# Altium footprint library Components.PcbLib: 127 footprints (part 5 of 8)
Each footprint in its own frame and in the unit in brackets; x right, y up, seen from the top. Pads: shape width x height; smd on the part's side, far side on the other; paste and mask are expansions set on the pad; w line width, h text height; cw(c..) or ccw(c..) is an arc to the next point about the centre after c.
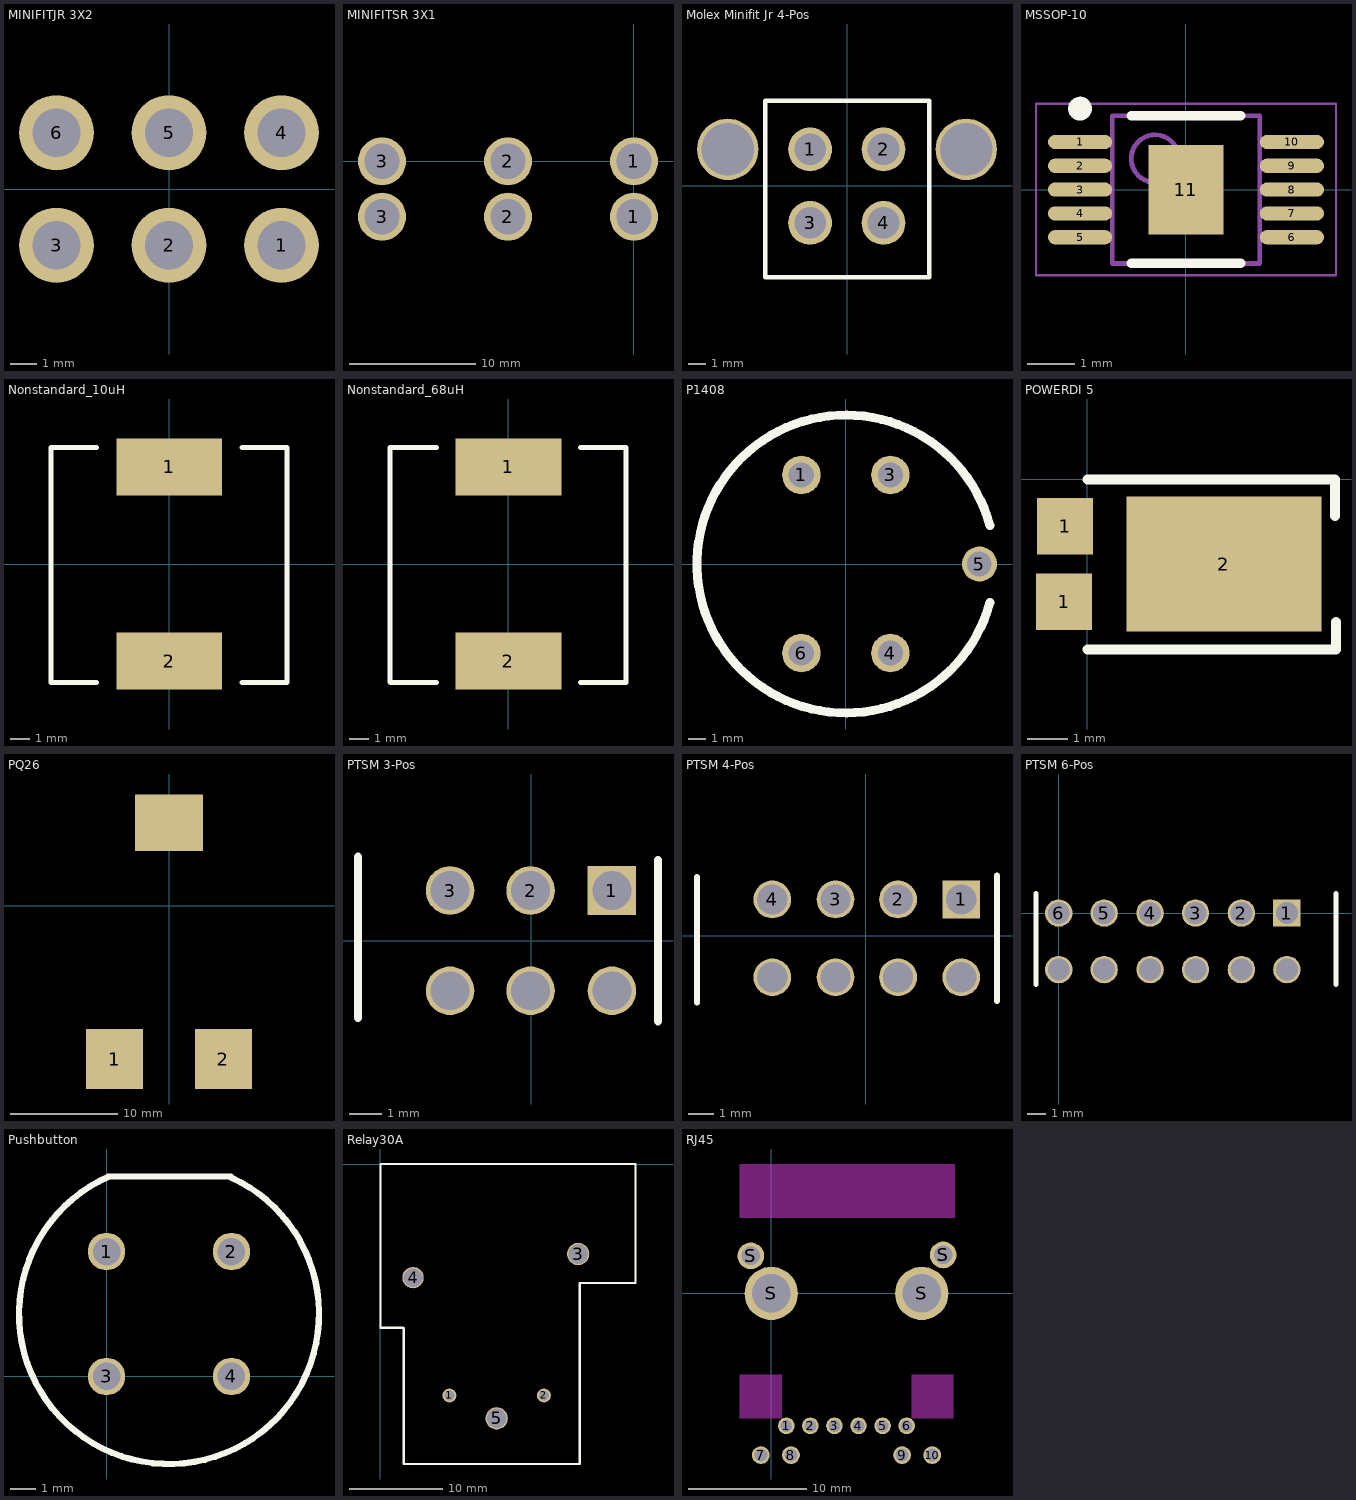
[diagram p4: the footprints below, top view; thin cyan lines are the x and y axes]

## MINIFITJR 3X2 [mil]
pads (6):
  round 110 hole 71: 1(165,-82.5) 2(0,-82.5) 3(-165,-82.5) 4(165,82.5) 5(0,82.5) 6(-165,82.5)
via 350,90 diameter 160 hole 118
via -350,90 diameter 160 hole 118
3D body "minifitjr3x2.stp": height 537.72, standoff -141.81, extent -410.62,-195.97 410.64,237.1

## MINIFITSR 3X1 [mil]
pads (6):
  round 150 hole 110: 1(0,-173) 1(0,0) 2(-393.7,-173) 2(-393.7,0) 3(-787.4,-173) 3(-787.4,0)
via -1012.99,-159 diameter 160 hole 118
via 226,-159 diameter 160 hole 118
3D body "minifitsr3x1.stp": height 819.01, standoff -147.52, extent -1059.74,-379.56 271.75,175.56

## Molex Minifit Jr 4-Pos [mm]
height 15
pads (6):
  round 2.5 hole 1.8: 1(-2.108,2.083) 2(2.083,2.083) 3(-2.108,-2.108) 4(2.083,-2.108)
  round 3.5 hole 3: ""(-6.807,2.083) ""(6.807,2.083)
Top Overlay:
  lines w0.254: -4.674,-5.207 4.699,-5.207 4.699,4.851 -4.674,4.851 -4.674,-5.207

## MountHole_M3 [mm]
via 0,0 diameter 6.35 hole 3.556
via 0,-2.54 diameter 1.016 hole 0.508
via 2.54,0 diameter 1.016 hole 0.508
via 0,2.54 diameter 1.016 hole 0.508
via -2.54,0 diameter 1.016 hole 0.508
3D body "M3x8 Philips Screw.stp": height 1.8, standoff -8, extent -2.65,-2.54 2.65,2.76

## MSSOP-10 [mm] "TSSOP, 10-Leads, Body 3.00x3.00mm, Pitch 0.50mm, Thermal Pad 1.88x1.57mm, IPC Medium Density"
height 1.1
pads (11):
  oval 1.35x0.3 smd: 1(-2.225,1) 2(-2.225,0.5) 3(-2.225,0) 4(-2.225,-0.5) 5(-2.225,-1) 6(2.225,-1) 7(2.225,-0.5) 8(2.225,0) 9(2.225,0.5) 10(2.225,1)
  rect 1.57x1.88 smd: 11(0,0)
Top Overlay:
  circle w0.25: c-2.225,1.7 r0.125
  lines w0.2: -1.15,-1.55 1.15,-1.55 ; -1.15,1.55 1.15,1.55
Mechanical 13:
  circle w0.1: c-0.65,0.65 r0.5
  lines w0.1: -1.55,-1.55 1.55,-1.55 1.55,1.55 -1.55,1.55 -1.55,-1.55
Mechanical 15:
  lines w0.05: -3.15,-1.8 3.15,-1.8 3.15,1.8 -3.15,1.8 -3.15,-1.8
  lines w0.1: -0.5,0 0.5,0 ; 0,-0.5 0,0.5
3D body "TSSOP50P490X110_HS-11N.step": height 1.1, standoff 0, extent -2.45,-1.55 2.45,1.55

## Nonstandard_10uH [mm]
pads (2):
  rect 5.4x2.9 smd: 1(0,4.95) 2(0,-4.95)
Top Overlay:
  lines w0.254: -3.708,-6.05 -6.02,-6.05 -6.02,5.95 -3.708,5.95 ; 3.708,-6.05 5.994,-6.05 5.994,5.95 3.708,5.95
3D body "Nonstandard_10uH.stp": height 5.97, standoff -0.03, extent -6,-6.05 6,5.95

## Nonstandard_68uH [mm]
pads (2):
  rect 5.4x2.9 smd: 1(0,4.95) 2(0,-4.95)
Top Overlay:
  lines w0.254: -3.683,-6.05 -6.02,-6.05 -6.045,-6.025 -6.045,5.95 -3.683,5.95 ; 3.683,-6.05 5.994,-6.05 5.994,5.95 3.683,5.95
3D body "Nonstandard_68uH.stp": height 9.45, standoff 0, extent -6,-6.05 6,5.95

## P1408 [mm]
pads (5):
  round 2.2 hole 1.45: 1(-2.54,5.08) 3(2.54,5.08) 4(2.54,-5.08) 6(-2.54,-5.08)
  round 2 hole 1.4: 5(7.62,0)
Top Overlay:
  lines w0.508: 8.21,-2.2 cw(c0,0) 8.21,2.2
3D body "P1408.step": height 12, standoff 0, extent -8.2,-8.2 8.2,8.2

## POWERDI 5 [mm]
pads (3):
  rect 1.4x1.4 smd: 1(-0.584,-3.048) 1(-0.559,-1.168)
  rect 4.86x3.36 smd: 2(3.404,-2.108)
Top Overlay:
  lines w0.254: 0,-4.242 6.198,-4.242 6.198,-3.556 ; 0,0 5.613,0 6.172,0 6.172,-0.914
3D body "PowerDI5.stp": height 0.56, standoff -0.54, extent -0.66,-4.119 5.984,-0.149

## PQ26 [mm]
pads (3):
  rect 5.33x5.59 smd: 1(-5.085,-14.36) 2(5.085,-14.36)
  rect 6.35x5.28 smd: ""(0,7.72)
3D body "PQ2614BLA.stp": height 15, standoff -0.1, extent -13.31,-16.35 13.49,10.825

## PTSM 3-Pos [mm]
pads (6):
  rect 1.5x1.5 hole 1.2: 1(2.489,1.549)
  round 1.5 hole 1.2: 2(-0.025,1.549) 3(-2.515,1.549) ""(-2.515,-1.549) ""(-0.025,-1.549) ""(2.489,-1.549)
Top Overlay:
  lines w0.254: -5.359,-2.388 -5.359,2.591 ; 3.912,-2.489 3.912,2.489
3D body "PTSM 3-Pos.stp": height 10.46, standoff -1.64, extent -4.877,-2.373 3.123,2.627

## PTSM 4-Pos [mm]
pads (8):
  rect 1.5x1.5 hole 1.2: 1(3.81,1.448)
  round 1.5 hole 1.2: 2(1.295,1.448) 3(-1.194,1.448) 4(-3.708,1.448) ""(-3.708,-1.651) ""(-1.194,-1.651) ""(1.295,-1.651) ""(3.81,-1.651)
Top Overlay:
  lines w0.254: -6.706,-2.642 -6.706,2.337 ; 5.232,-2.591 5.232,2.388
3D body "PTSM 4-Pos.stp": height 10.46, standoff -1.64, extent -6.045,-2.602 4.455,2.398

## PTSM 6-Pos [mm]
height 10
pads (12):
  rect 1.5x1.5 hole 1.2: 1(12.497,0)
  round 1.5 hole 1.2: 2(10.008,0) 3(7.493,0) 4(5.004,0) 5(2.489,0) 6(0,0) ""(0,-3.099) ""(2.489,-3.099) ""(5.004,-3.099) ""(7.493,-3.099) ""(10.008,-3.099) ""(12.497,-3.099)
Top Overlay:
  lines w0.254: -1.245,-3.912 -1.245,1.067 ; 15.189,-3.912 15.189,1.067
3D body "PTSM 6-Pos.stp": height 10.46, standoff -1.64, extent -0.686,-4.075 14.814,0.925

## Pushbutton [mm]
pads (4):
  round 1.5 hole 1.1: 1(0,5) 2(5,5) 3(0,0) 4(5,0)
Top Overlay:
  lines w0.254: 0.059,7.981 ccw(c2.5,2.5) 4.983,7.962 ; 0.059,8 4.983,8
3D body: height 14.35, standoff 1.55, extent -3.5,-3.5 8.5,8

## Relay30A [mm]
height 20.4
pads (5):
  round 1.5 hole 1.1: 1(7.417,-24.892) 2(17.577,-24.892)
  round 2.4 hole 2.1: 3(21.26,-9.677) 5(12.497,-27.356)
  round 2.3 hole 2: 4(3.505,-12.217)
Top Overlay:
  lines w0.254: 2.413,-17.602 0,-17.602 0,0 27.432,0 27.432,-12.802 21.412,-12.802 21.412,-32.258 2.489,-32.258 2.489,-17.678

## RJ45 [mm]
pads (14):
  round 1.4 hole 1: 1(1.27,-11.17) 2(3.3,-11.17) 3(5.33,-11.17) 4(7.36,-11.17) 5(9.39,-11.17) 6(11.42,-11.17)
  round 1.5 hole 1.1: 7(-0.88,-13.64) 8(1.66,-13.64) 9(11.04,-13.64) 10(13.58,-13.64)
  round 2.25 hole 1.57: S(-1.72,3.17) S(14.5,3.25)
  round 4.5 hole 3.25: S(0,0) S(12.7,0)
Keep-Out Layer:
  rectangle: 11.811,-10.541 15.367,-6.858
  rectangle: -2.667,-10.541 0.889,-6.858
  rectangle: -2.667,6.35 15.494,10.922
3D body: height 13.49, standoff 0, extent -1.803,-14.605 14.503,10.922